# Altium footprint library UZohmADC.PcbLib: 42 footprints (part 2 of 3)
Each footprint in its own frame and in the unit in brackets; x right, y up, seen from the top. Pads: shape width x height; smd on the part's side, far side on the other; paste and mask are expansions set on the pad; w line width, h text height; cw(c..) or ccw(c..) is an arc to the next point about the centre after c.
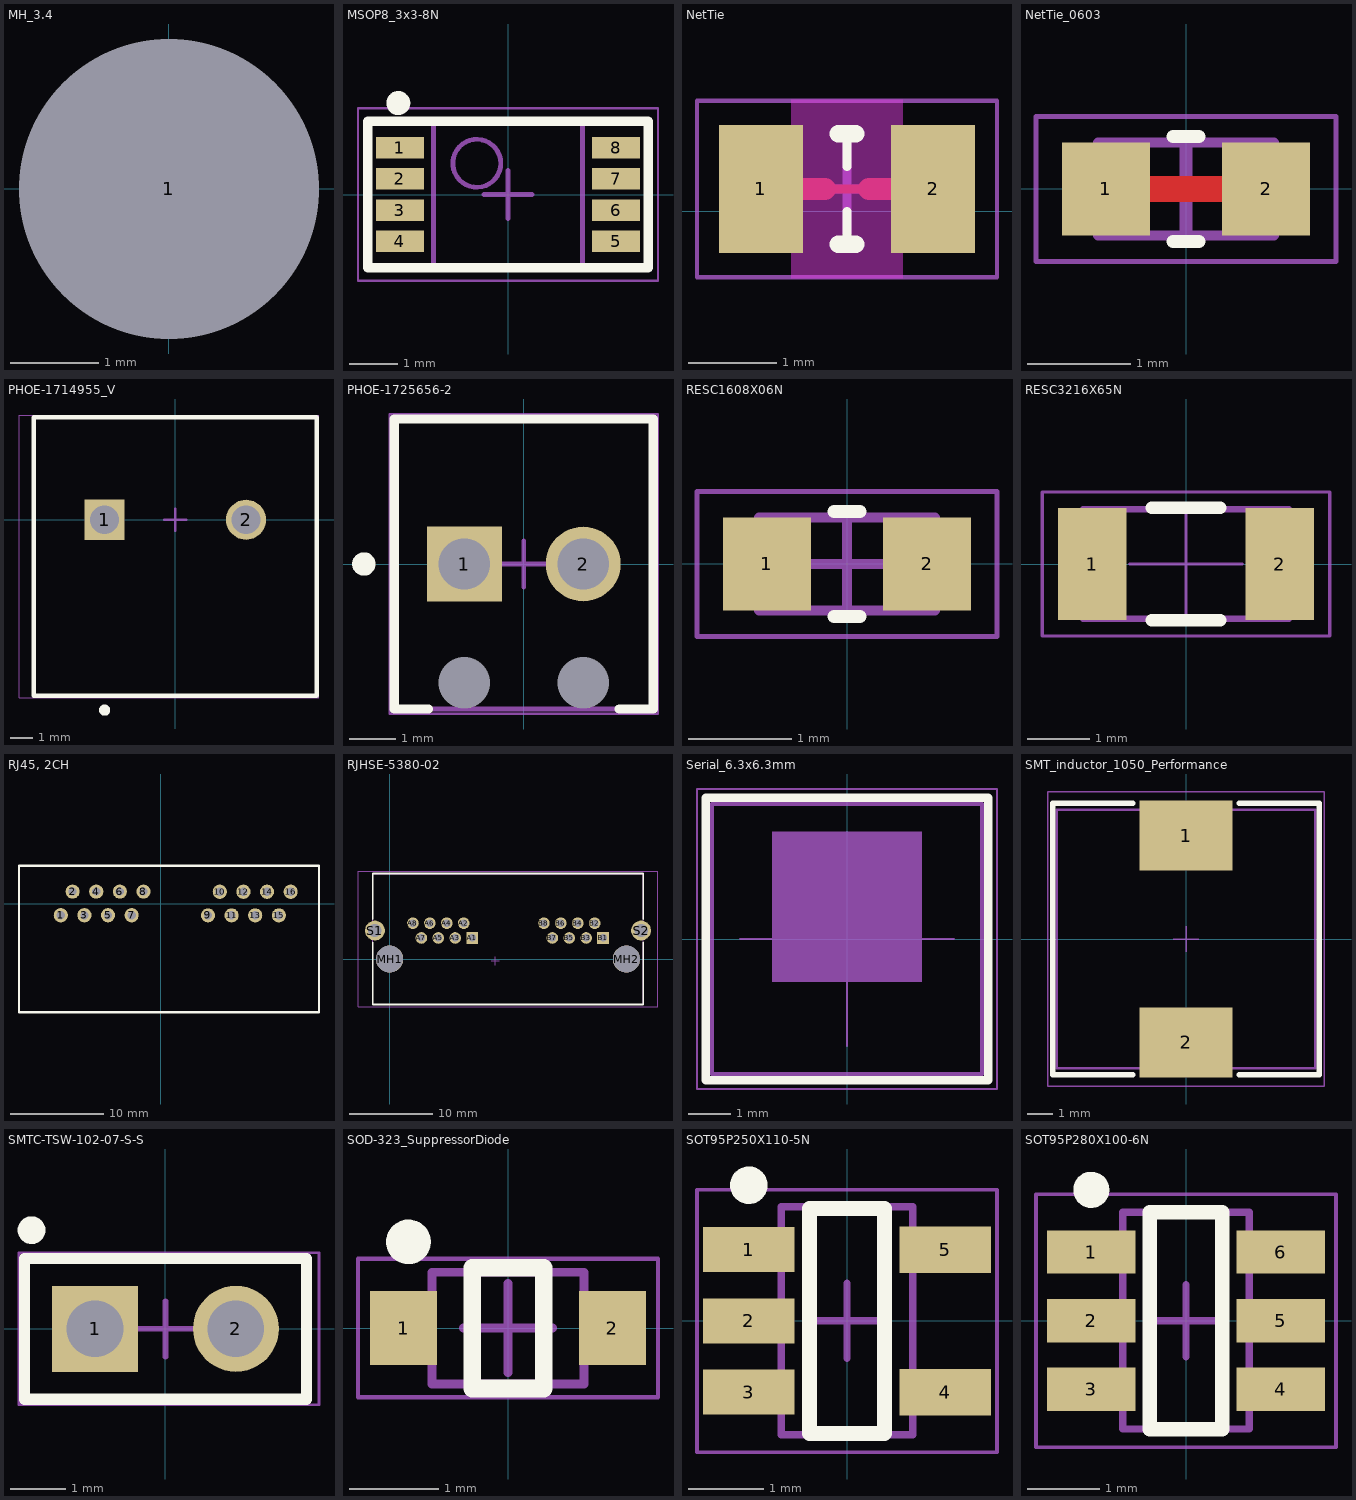
[diagram p1: the footprints below, top view; thin cyan lines are the x and y axes]

## MH_3.4 [mm]
pads (1):
  round 3.1 hole 3.4 unplated: 1(0,0)

## MSOP8_3x3-8N [mm] "TSOP, 8-Leads, Body 3,00x3,00mm, Pitch 0,65mm, IPC Medium Density"
height 1
pads (8):
  rect 1x0.45 smd mask+0.051: 1(-2.25,0.975) 2(-2.25,0.325) 3(-2.25,-0.325) 4(-2.25,-0.975) 5(2.25,-0.975) 6(2.25,-0.325) 7(2.25,0.325) 8(2.25,0.975)
Top Overlay:
  circle w0.25: c-2.286,1.905 r0.125
  lines w0.2: -2.921,-1.524 -2.921,1.524 2.921,1.524 2.921,-1.524 -2.921,-1.524
Mechanical 5:
  circle w0.1: c-0.65,0.65 r0.5
  lines w0.1: -1.55,-1.55 -1.55,1.55 1.55,1.55 1.55,-1.55 -1.55,-1.55
  text ".Designator" at 0,0 h1.52
Mechanical 15:
  lines w0.05: -3.125,-1.8 -3.125,1.8 3.125,1.8 3.125,-1.8 -3.125,-1.8
  lines w0.1: -0.5,0 0.5,0 ; 0,-0.5 0,0.5
3D body "User Library-MSOP8.STEP": height 1.1, standoff 0, extent -2.469,-1.55 2.469,1.55

## NetTie [mm]
pads (2):
  rect 0.95x1.45 smd: 1(-3.769,0.254) 2(-1.819,0.254)
Top Layer:
  lines w0.102: -3.048,0.254 -2.54,0.254
  lines w0.254: -3.769,0.254 -3.048,0.254 ; -2.54,0.254 -1.778,0.254
Top Overlay:
  lines w0.102: -2.794,-0.254 -2.794,0 ; -2.794,0.508 -2.794,0.879
  lines w0.2: -2.894,-0.371 -2.694,-0.371 ; -2.894,0.879 -2.694,0.879
Keep-Out Layer:
  rectangle: -3.429,-0.762 -2.159,1.27
Mechanical 15:
  lines w0.05: -4.494,-0.746 -1.094,-0.746 -1.094,1.254 -4.494,1.254 -4.494,-0.746
  lines w0.1: -3.294,0.254 -2.294,0.254 ; -2.794,-0.246 -2.794,0.762

## NetTie_0603 [mm] "Chip Resistor, 2-Leads, Body 1,60x0,80mm, IPC Medium Density"
height 0.55
pads (2):
  rect 0.85x0.9 smd: 1(-0.775,0) 2(0.775,0)
Top Layer:
  lines w0.254: -0.775,0 0.775,0
Top Overlay:
  lines w0.127: -0.127,-0.508 0.127,-0.508 ; -0.127,0.508 0.127,0.508
Mechanical 5:
  lines w0.1: -0.85,-0.45 -0.85,0.45 0.85,0.45 0.85,-0.45 -0.85,-0.45
  text ".Designator" at 0,0 h1.02
Mechanical 8:
  lines w0.127: 0,-0.5 0,0.5
Mechanical 15:
  lines w0.05: -1.45,-0.7 1.45,-0.7 1.45,0.7 -1.45,0.7 -1.45,-0.7
  lines w0.1: -0.45,0 0.45,0 ; 0,-0.45 0,0.45

## PHOE-1714955_V [mm] "Terminal Block, 2-Leads, Body 12.7x12.5mm, Pitch 6.35mm"
height 21.5
pads (2):
  rect 1.8x1.8 hole 1.3: 1(-3.175,0)
  round 1.8 hole 1.3: 2(3.175,0)
Top Overlay:
  circle w0.25: c-3.175,-8.55 r0.125
  lines w0.2: -6.35,-7.9 6.35,-7.9 6.35,4.6 -6.35,4.6 -6.35,-7.9
Mechanical 5:
  lines w0.1: -6.35,-7.9 6.35,-7.9 6.35,4.6 -6.35,4.6 -6.35,-7.9
  text ".Designator" at 2.413,5.08 h1.52
Mechanical 15:
  lines w0.05: -7.02,-8 6.45,-8 6.45,4.7 -7.02,4.7 -7.02,-8
  lines w0.1: -0.5,0 0.5,0 ; 0,-0.5 0,0.5
3D body "1714955_03.stp": height 21.51, standoff -4.99, extent -6.92,-7.9 6.35,4.6

## PHOE-1725656-2 [mm] "Connector, 2-Leads, Body 6.2x5.4mm, Pitch 2.54mm"
height 8.5
pads (4):
  rect 1.6x1.6 hole 1.1: 1(-1.27,0)
  round 1.6 hole 1.1: 2(1.27,0)
  round 0 hole 1.1 unplated: MH1(-1.27,-2.54) MH2(1.27,-2.54)
Top Overlay:
  circle w0.25: c-3.42,0 r0.125
  lines w0.2: -2.038,-3.1 -2.77,-3.1 -2.77,3.1 2.77,3.1 2.77,-3.1 2.038,-3.1
Mechanical 5:
  lines w0.1: -2.77,-3.1 2.77,-3.1 2.77,3.1 -2.77,3.1 -2.77,-3.1
  text ".Designator" at 0.254,3.429 h1.52
Mechanical 15:
  lines w0.05: -2.87,-3.2 2.87,-3.2 2.87,3.2 -2.87,3.2 -2.87,-3.2
  lines w0.1: -0.5,0 0.5,0 ; 0,-0.5 0,0.5
3D body "1725656.stp": height 9, standoff -3, extent -2.77,-3.1 2.77,3.1

## RESC1608X06N [mm] "Chip Resistor, 2-Leads, Body 1,60x0,80mm, IPC Medium Density"
height 0.55
pads (2):
  rect 0.85x0.9 smd: 1(-0.775,0) 2(0.775,0)
Top Overlay:
  lines w0.127: -0.127,-0.508 0.127,-0.508 ; -0.127,0.508 0.127,0.508
Mechanical 5:
  lines w0.1: -0.85,-0.45 -0.85,0.45 0.85,0.45 0.85,-0.45 -0.85,-0.45
  text ".Designator" at 0,0 h1.02
Mechanical 15:
  lines w0.05: -1.45,-0.7 -1.45,0.7 1.45,0.7 1.45,-0.7 -1.45,-0.7
  lines w0.1: -0.45,0 0.45,0 ; 0,-0.45 0,0.45
3D body "0603-Rchip.step": height 0.44, standoff -0.01, extent -0.8,-0.4 0.8,0.4

## RESC3216X65N [mm] "Vishay D1206 3.2 x 1.6 (+/- 0.15), 0.2mm - 0.6mm Kontakte"
height 0.65
pads (2):
  rect 1.1x1.8 smd: 1(-1.5,0) 2(1.5,0)
Top Overlay:
  lines w0.2: -0.55,-0.9 0.55,-0.9 ; -0.55,0.9 0.55,0.9
Mechanical 5:
  lines w0.1: -1.1,-0.875 -1.1,0.875 ; 1.1,-0.875 1.1,0.875 ; -1.65,-0.875 -1.65,0.875 1.65,0.875 1.65,-0.875 0,-0.875 -1.65,-0.875
  text ".Designator" at 0,0 h1
Mechanical 15:
  lines w0.05: -0.9,0 0,0 ; 0,-0.9 0,0 ; 0,0.9 0,0 ; 0.9,0 0,0 ; -2.3,-1.15 -2.3,1.15 2.3,1.15 2.3,-1.15 0,-1.15 -2.3,-1.15
3D body "RESC3216X06N.STEP": height 0.55, standoff 0, extent -1.6,-0.8 1.6,0.8

## RJ45, 2CH [mil]
pads (16):
  round 60 hole 35: 1(-423.07,-49.37) 2(-373.07,50.63) 3(-323.07,-49.37) 4(-273.07,50.63) 5(-223.07,-49.37) 6(-173.07,50.63) 7(-123.07,-49.37) 8(-73.07,50.63) 9(200,-50) 10(250,50) 11(300,-50) 12(350,50) 13(400,-50) 14(450,50) 15(500,-50) 16(550,50)
Top Overlay:
  lines w10: -600,-460 670,-460 670,160 -600,160 -600,-460

## RJHSE-5380-02 [mm] "Modular Jack Horizontal Shielded Dual Port 8P8C Tab Up"
height 13.75
pads (20):
  rect 1.4x1.4 hole 0.9: A1(9.906,2.54) B1(25.654,2.54)
  round 1.4 hole 0.9: A2(8.89,4.318) A3(7.874,2.54) A4(6.858,4.318) A5(5.842,2.54) A6(4.826,4.318) A7(3.81,2.54) A8(2.794,4.318) B2(24.638,4.318) B3(23.622,2.54) B4(22.606,4.318) B5(21.59,2.54) B6(20.574,4.318) B7(19.558,2.54) B8(18.542,4.318)
  round 3.25 hole 3.25 unplated: MH1(0,0) MH2(28.448,0)
  round 2.4 hole 1.6: S1(-1.778,3.429) S2(30.226,3.429)
Top Overlay:
  lines w0.203: -2.032,2.032 -2.032,-5.461 30.48,-5.461 30.48,2.032 ; -2.032,4.826 -2.032,10.287 30.48,10.287 30.48,4.826
Mechanical 5:
  lines w0.1: -2.032,-5.461 -2.032,10.287 30.48,10.287 30.48,-5.461 -2.032,-5.461
  text ".Designator" at 12.7,-0.215 h1.02
Mechanical 15:
  lines w0.05: 12.2,-0.215 13.2,-0.215 ; 12.7,-0.715 12.7,0.285 ; -3.81,-5.715 -3.81,10.541 32.258,10.541 32.258,-5.715 -3.81,-5.715
3D body "RJHSE-5380-02-REVT1.step": height 15.06, standoff -3.78, extent -3.503,-5.41 31.951,10.287

## Serial_6.3x6.3mm [mm]
Top Overlay:
  lines w0.2: -3.3,-3.3 3.3,-3.3 3.3,3.3 -3.3,3.3 -3.3,-3.3
Mechanical 5:
  region: -1.75,2.5 -1.75,-1 1.75,-1 1.75,2.5
  lines w0.1: -3.15,-3.15 3.15,-3.15 3.15,3.15 -3.15,3.15 -3.15,-3.15
  text ".Designator" at 0,0 h1.02
  text "SerialNr" at 2.5,-1.7 h0.7
Mechanical 15:
  lines w0.05: -2.5,0 2.5,0 ; 0,-2.5 0,2.5 ; -3.5,-3.5 3.5,-3.5 3.5,3.5 -3.5,3.5 -3.5,-3.5

## SMT_inductor_1050_Performance [mm] "SMD Shielded Power Inductor, 2-leads, body 10.3x10.5mm"
height 5
pads (2):
  rect 3.6x2.7 smd: 1(0,4) 2(0,-4)
Top Overlay:
  lines w0.2: -2.05,-5.25 -5.15,-5.25 -5.15,5.25 -2.05,5.25 ; 2.05,-5.25 5.15,-5.25 5.15,5.25 2.05,5.25
Mechanical 5:
  lines w0.1: -5,-5 5,-5 5,5 -5,5 -5,-5
  text ".Designator" at 0,0 h1.02
Mechanical 15:
  lines w0.05: -0.5,0 0.5,0 ; 0,-0.5 0,0.5 ; -5.35,-5.7 5.35,-5.7 5.35,5.7 -5.35,5.7 -5.35,-5.7
3D body "7447714xx.stp": height 4.79, standoff -0.01, extent -5,-5 5,5

## SMTC-TSW-102-07-S-S [mm] "Header, 2-Leads, Body 5.08x2.54mm, Pitch 2.54mm"
height 8.38
pads (2):
  rect 1.55x1.55 hole 1.02: 1(-1.27,0)
  round 1.55 hole 1.02: 2(1.27,0)
Top Overlay:
  circle w0.25: c-2.413,1.778 r0.125
  lines w0.2: -2.54,-1.27 2.54,-1.27 2.54,1.27 -2.54,1.27 -2.54,-1.27
Mechanical 5:
  lines w0.1: -2.54,-1.27 -2.54,1.27 2.54,1.27 2.54,-1.27 -2.54,-1.27
  text ".Designator" at 0.317,1.651 h1.52
Mechanical 15:
  lines w0.05: -2.64,-1.37 -2.64,1.37 2.767,1.37 2.767,-1.37 -2.64,-1.37
  lines w0.1: -0.5,0 0.5,0 ; 0,-0.5 0,0.5
3D body "TSW-102-07-S-S.stp": height 8.38, standoff -2.54, extent -2.54,-1.27 2.667,1.27

## SOD-323_SuppressorDiode [mm] "SOD, 2-Leads, Body 1.7x1.25mm"
height 1.062
pads (2):
  rect 0.75x0.83 smd: 1(-1.17,0) 2(1.17,0)
Top Overlay:
  circle w0.25: c-1.115,0.965 r0.125
  lines w0.2: -0.4,-0.675 -0.4,0.675 0.4,0.675 0.4,-0.675 -0.4,-0.675
Mechanical 5:
  lines w0.1: -0.85,-0.625 0.85,-0.625 0.85,0.625 -0.85,0.625 -0.85,-0.625
  text ".Designator" at -4.826,0.772 h1.02
Mechanical 15:
  lines w0.05: -1.68,-0.775 -1.68,0.775 1.68,0.775 1.68,-0.775 -1.68,-0.775
  lines w0.1: -0.5,0 0.5,0 ; 0,-0.5 0,0.5
3D body: height 1.06, standoff 0, extent -0.85,-0.625 0.85,0.625

## SOT95P250X110-5N [mm] "SOT23, 5-Leads, Body 2,92x2,50mm, Pitch 0,95mm, IPC Medium Density"
height 1.1
pads (5):
  rect 1.22x0.6 smd: 1(-1.31,0.95) 2(-1.31,0) 3(-1.31,-0.95)
  rect 1.22x0.62 smd: 4(1.31,-0.95) 5(1.31,0.95)
Top Overlay:
  circle w0.25: c-1.31,1.81 r0.125
  lines w0.2: -0.5,-1.5 -0.5,1.5 0.5,1.5 0.5,-1.5 -0.5,-1.5
Mechanical 5:
  lines w0.1: -0.875,-1.52 0.875,-1.52 0.875,1.52 -0.875,1.52 -0.875,-1.52
  text ".Designator" at 0,0 h1.02
Mechanical 15:
  lines w0.05: -2,-1.75 2,-1.75 2,1.75 -2,1.75 -2,-1.75
  lines w0.1: -0.5,0 0.5,0 ; 0,-0.5 0,0.5
3D body: height 1.1, standoff 0.01, extent -0.875,-1.52 0.875,1.52

## SOT95P280X100-6N [mm] "SOT23, 6-Leads, Body 2,90x2,80mm, Pitch 0,95mm, IPC Medium Density"
height 1
pads (6):
  rect 1.22x0.6 smd: 1(-1.31,0.95) 2(-1.31,0) 3(-1.31,-0.95) 4(1.31,-0.95) 5(1.31,0) 6(1.31,0.95)
Top Overlay:
  circle w0.25: c-1.31,1.81 r0.125
  lines w0.2: -0.5,-1.5 0.5,-1.5 0.5,1.5 -0.5,1.5 -0.5,-1.5
Mechanical 5:
  lines w0.1: -0.875,-1.5 0.875,-1.5 0.875,1.5 -0.875,1.5 -0.875,-1.5
  text ".Designator" at 0,0 h1.02
Mechanical 15:
  lines w0.05: -2.075,-1.75 -2.075,1.75 2.075,1.75 2.075,-1.75 -2.075,-1.75
  lines w0.1: -0.5,0 0.5,0 ; 0,-0.5 0,0.5
3D body: height 1, standoff 0.01, extent -0.875,-1.5 0.875,1.5